# Altium schematic symbol library LATTICEPLDS_Library.SchLib: 291 symbols (part 31 of 32)
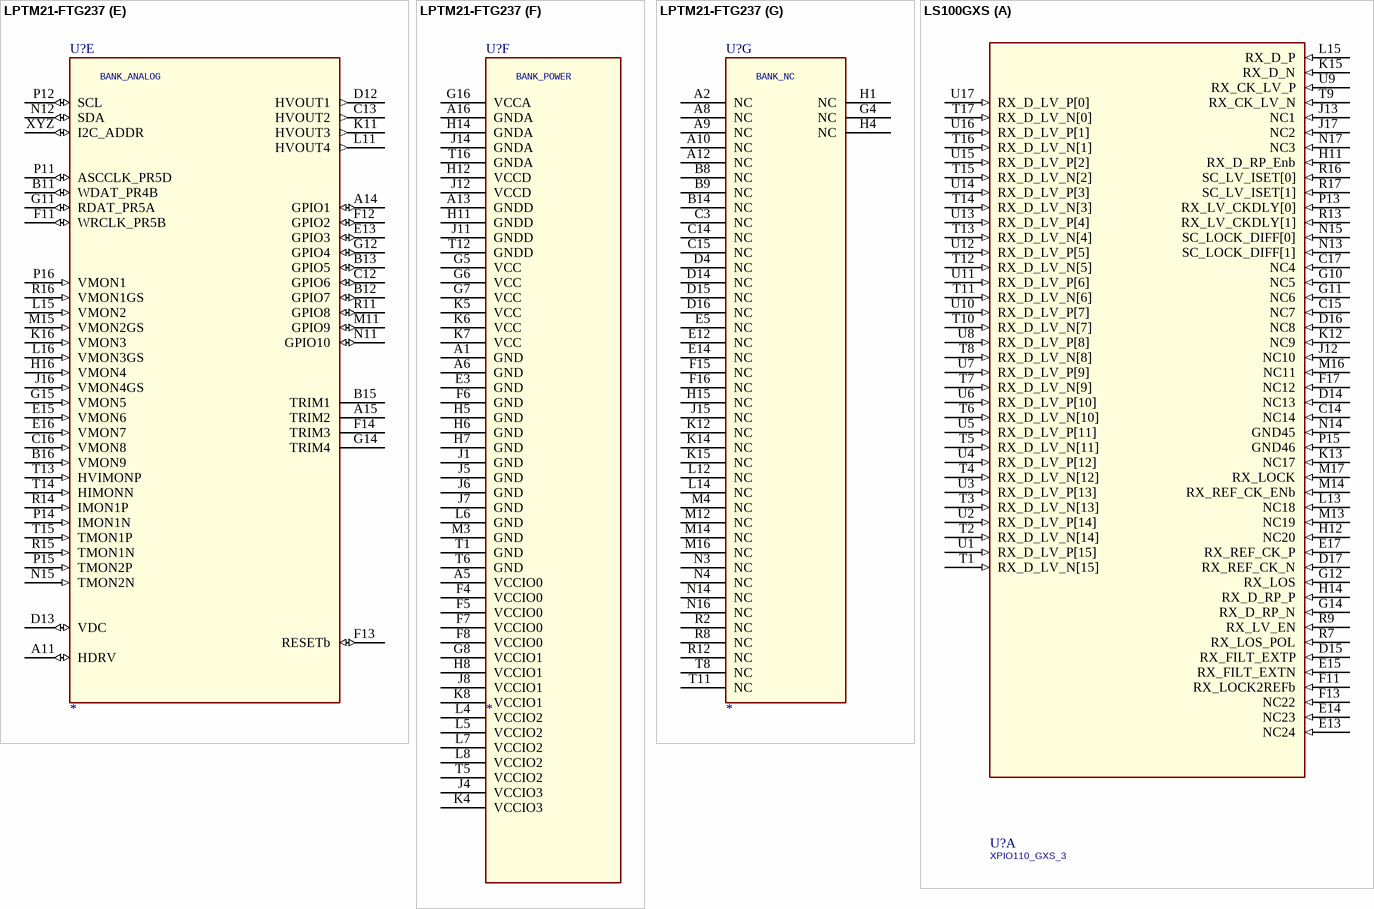
[diagram p333: symbols LPTM21-FTG237 to LS100GXS]

## LPTM21-FTG237
designator U?
part A pins: D1 PL2C || L_GPLLT_IN (io), D2 PL2B || L_GPLLC_FB (io), E1 PL2D || L_GPLLC_IN (io), E2 PL2A || L_GPLLT_FB (io), F1 PL3C (io), F2 PL3A || PCLKT3_2 (io), F3 PL3B || PCLKC3_2 (io), G1 PL3D (io), G2 PL4A (io), G3 PL4B (io), H2 PL4D (io), H3 PL4C (io), J2 PL5A || PCLKT3_1 (io), J3 PL5B || PCLKC3_1 (io), K1 PL8C (io), K2 PL8B (io), K3 PL8A (io), L1 PL8D (io), L2 PL9B || PCLKC3_0 (io), L3 PL9A || PCLKT3_0 (io), M1 PL10A (io), M2 PL10D (io), N1 PL10B (io), N2 PL10C (io)
part B pins: M5 PB4D (io), M6 PB9D (io), M7 PB15D (io), M8 PB20B (io), N5 PB9C (io), N6 PB11A || PCLKT2_1 (io), N7 PB15C (io), N8 PB20A (io), P1 PB4B (io), P2 PB4C || CSSPIN/MD4/TDO8 (io), P3 PB6A (io), P4 PB9A || PCLKT2_0 (io), P5 PB11D (io), P6 PB11B || PCLKC2_1 (io), P7 PB18C (io), P8 PB18D (io), R1 PB4A (io), R3 PB6C || MCLK/CCLK (io), R4 PB9B || PCLKC2_0 (io), R5 PB15A (io), R6 PB15B (io), R7 PB18B (io), R9 PB20D || SI/SIPI/IO0/MD0/TDOR (io), T2 PB6B (io), T3 PB6D || SO/SPISO/IO1/MD1/TDIL (io), T4 PB11C (io), T7 PB18A (io), T9 PB20C || SN/MDS/SCA (io)
part C pins: B10 PR5C (io), C10 PR2B (io), C11 PR2C (io), D8 PT17A (io), D10 PR2A (io), D11 PR2D (io), E8 PT17B (io), E9 PR3B (io), E10 PR3A (io), F10 PR4B (io), L10 PR9A (io), M9 PR9C (io), M10 PR9D (io), N9 PR8D (io), N10 PR10A (io), P9 PR10C (io), P10 PR10B (io), R10 PR10D (io), T10 PR9B (io)
part D pins: A3 PT10D || TDI/MD7 (io), A4 PT12A || PCLKT0_1 (io), A7 PT16A (io), B1 PT9A (io), B2 PT9D (io), B3 PT10C || TDO (io), B4 PT11D || TMS (io), B5 PT15A (io), B6 PT15B (io), B7 PT16B (io), C1 PT9B (io), C2 PT9C (io), C4 PT11C || TCK (io), C5 PT12B || PCLKC0_1 (io), C6 PT12D || SDA/PCLKC (io), C7 PT16C (io), C8 PT16D (io), C9 PT17C || INITN (io), D3 PT10A (io), D5 PT11A (io), D6 PT12C || SCL/PCLKT (io), D7 PT15C || JTAGENb (io), D9 PT17D || DONE (io), E4 PT10B (io), E6 PT11B (io), E7 PT15D || PROGRAMN (io)
part E pins: A11 HDRV (io), A14 GPIO1 (io), A15 TRIM2, B11 WDAT_PR4B (io), B12 GPIO7 (io), B13 GPIO5 (io), B15 TRIM1, B16 VMON9 (in), C12 GPIO6 (io), C13 HVOUT2 (out), C16 VMON8 (in), D12 HVOUT1 (out), D13 VDC (io), E13 GPIO3 (io), E15 VMON6 (in), E16 VMON7 (in), F11 WRCLK_PR5B (io), F12 GPIO2 (io), F13 RESETb (io), F14 TRIM3, G11 RDAT_PR5A (io), G12 GPIO4 (io), G14 TRIM4, G15 VMON5 (in), H16 VMON4 (in), J16 VMON4GS (in), K11 HVOUT3 (out), K16 VMON3 (in), L11 HVOUT4 (out), L15 VMON2 (in), L16 VMON3GS (in), M11 GPIO9 (io), M15 VMON2GS (in), N11 GPIO10 (io), N12 SDA (io), N15 TMON2N (in), P11 ASCCLK_PR5D (io), P12 SCL (io), P14 IMON1N (in), P15 TMON2P (in), P16 VMON1 (in), R11 GPIO8 (io), R14 IMON1P (in), R15 TMON1N (in), R16 VMON1GS (in), T13 HVIMONP (in), T14 HIMONN (in), T15 TMON1P (in), XYZ I2C_ADDR (io)
part F pins: A1 GND (power), A5 VCCIO0 (power), A6 GND (power), A13 GNDD (power), A16 GNDA (power), E3 GND (power), F4 VCCIO0 (power), F5 VCCIO0 (power), F6 GND (power), F7 VCCIO0 (power), F8 VCCIO0 (power), G5 VCC (power), G6 VCC (power), G7 VCC (power), G8 VCCIO1 (power), G16 VCCA (power), H5 GND (power), H6 GND (power), H7 GND (power), H8 VCCIO1 (power), H11 GNDD (power), H12 VCCD (power), H14 GNDA (power), J1 GND (power), J4 VCCIO3 (power), J5 GND (power), J6 GND (power), J7 GND (power), J8 VCCIO1 (power), J11 GNDD (power), J12 VCCD (power), J14 GNDA (power), K4 VCCIO3 (power), K5 VCC (power), K6 VCC (power), K7 VCC (power), K8 VCCIO1 (power), L4 VCCIO2 (power), L5 VCCIO2 (power), L6 GND (power), L7 VCCIO2 (power), L8 VCCIO2 (power), M3 GND (power), T1 GND (power), T5 VCCIO2 (power), T6 GND (power), T12 GNDD (power), T16 GNDA (power)
part G pins: A2 NC (power), A8 NC (power), A9 NC (power), A10 NC (power), A12 NC (power), B8 NC (power), B9 NC (power), B14 NC (power), C3 NC (power), C14 NC (power), C15 NC (power), D4 NC (power), D14 NC (power), D15 NC (power), D16 NC (power), E5 NC (power), E12 NC (power), E14 NC (power), F15 NC (power), F16 NC (power), G4 NC (power), H1 NC (power), H4 NC (power), H15 NC (power), J15 NC (power), K12 NC (power), K14 NC (power), K15 NC (power), L12 NC (power), L14 NC (power), M4 NC (power), M12 NC (power), M14 NC (power), M16 NC (power), N3 NC (power), N4 NC (power), N14 NC (power), N16 NC (power), R2 NC (power), R8 NC (power), R12 NC (power), T8 NC (power), T11 NC (power)
part A text: BANK_TOP; PRI Function || SEC Function(s)
part B text: BANK_BOTTOM; PRI Function || SEC Function(s)
part C text: BANK_LEFT; PRI Function || SEC Function(s)
part D text: BANK_RIGHT; PRI Function || SEC Function(s)
part E text: BANK_ANALOG
part F text: BANK_POWER
part G text: BANK_NC

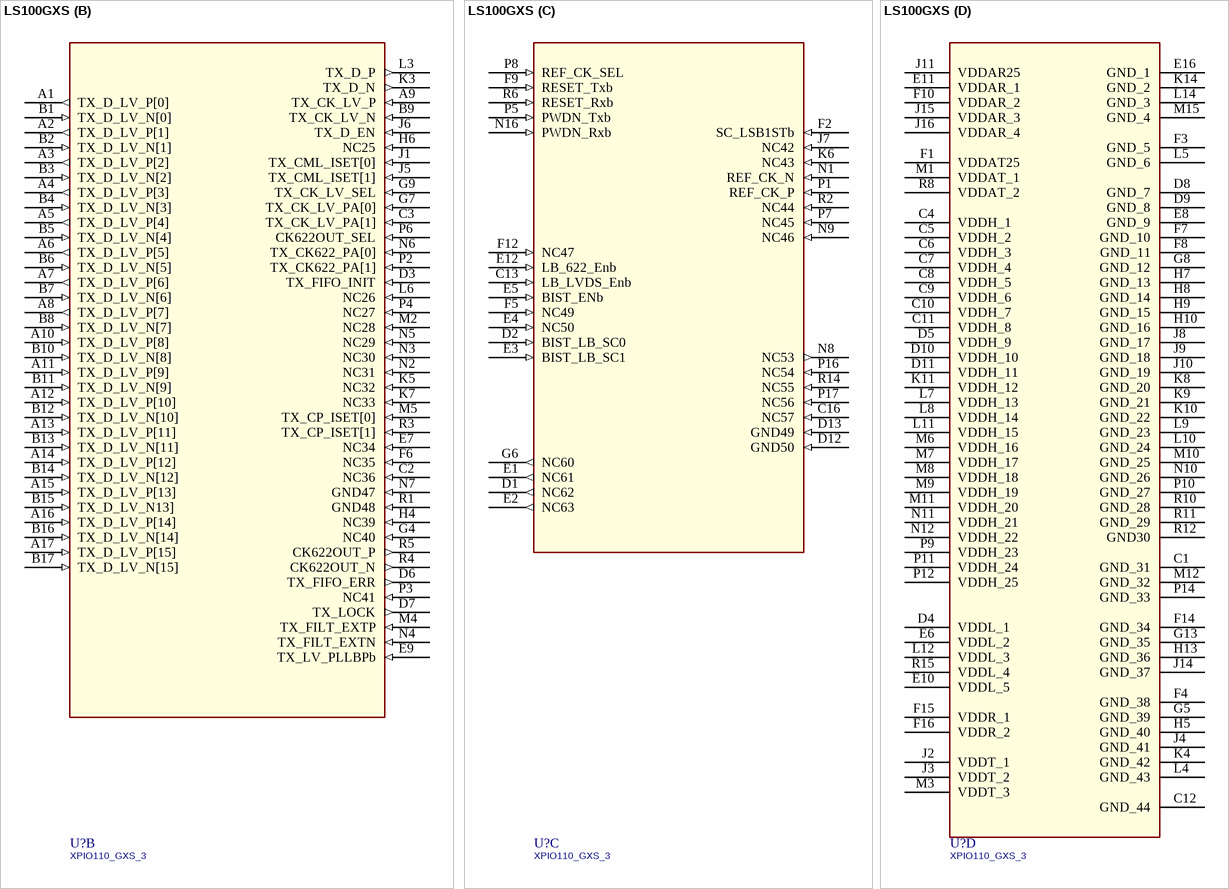
[diagram p285: symbol LS100GXS]

## LS100GXS
designator U?, comment XPIO110_GXS_3
part A pins: C14 NC14 (in), C15 NC7 (in), C17 NC4 (in), D14 NC13 (in), D15 RX_FILT_EXTP (in), D16 NC8 (in), D17 RX_REF_CK_N (in), E13 NC24 (in), E14 NC23 (in), E15 RX_FILT_EXTN (in), E17 RX_REF_CK_P (in), F11 RX_LOCK2REFb (in), F13 NC22 (in), F17 NC12 (in), G10 NC5 (in), G11 NC6 (in), G12 RX_LOS (in), G14 RX_D_RP_N (in), H11 RX_D_RP_Enb (in), H12 NC20 (in), H14 RX_D_RP_P (in), J12 NC10 (in), J13 NC1 (in), J17 NC2 (in), K12 NC9 (in), K13 NC17 (in), K15 RX_D_N (in), L13 NC18 (in), L15 RX_D_P (in), M13 NC19 (in), M14 RX_REF_CK_ENb (in), M16 NC11 (in), M17 RX_LOCK (in), N13 SC_LOCK_DIFF[1] (in), N14 GND45 (in), N15 SC_LOCK_DIFF[0] (in), N17 NC3 (in), P13 RX_LV_CKDLY[0] (in), P15 GND46 (in), R7 RX_LOS_POL (in), R9 RX_LV_EN (in), R13 RX_LV_CKDLY[1] (in), R16 SC_LV_ISET[0] (in), R17 SC_LV_ISET[1] (in), T1 RX_D_LV_N[15] (in), T2 RX_D_LV_N[14] (in), T3 RX_D_LV_N[13] (in), T4 RX_D_LV_N[12] (in), T5 RX_D_LV_N[11] (in), T6 RX_D_LV_N[10] (in), T7 RX_D_LV_N[9] (in), T8 RX_D_LV_N[8] (in), T9 RX_CK_LV_N (in), T10 RX_D_LV_N[7] (in), T11 RX_D_LV_N[6] (in), T12 RX_D_LV_N[5] (in), T13 RX_D_LV_N[4] (in), T14 RX_D_LV_N[3] (in), T15 RX_D_LV_N[2] (in), T16 RX_D_LV_N[1] (in), T17 RX_D_LV_N[0] (in), U1 RX_D_LV_P[15] (in), U2 RX_D_LV_P[14] (in), U3 RX_D_LV_P[13] (in), U4 RX_D_LV_P[12] (in), U5 RX_D_LV_P[11] (in), U6 RX_D_LV_P[10] (in), U7 RX_D_LV_P[9] (in), U8 RX_D_LV_P[8] (in), U9 RX_CK_LV_P (in), U10 RX_D_LV_P[7] (in), U11 RX_D_LV_P[6] (in), U12 RX_D_LV_P[5] (in), U13 RX_D_LV_P[4] (in), U14 RX_D_LV_P[3] (in), U15 RX_D_LV_P[2] (in), U16 RX_D_LV_P[1] (in), U17 RX_D_LV_P[0] (in)
part B pins: A1 TX_D_LV_P[0] (out), A2 TX_D_LV_P[1] (out), A3 TX_D_LV_P[2] (out), A4 TX_D_LV_P[3] (out), A5 TX_D_LV_P[4] (out), A6 TX_D_LV_P[5] (out), A7 TX_D_LV_P[6] (out), A8 TX_D_LV_P[7] (out), A9 TX_CK_LV_P (in), A10 TX_D_LV_P[8] (in), A11 TX_D_LV_P[9] (in), A12 TX_D_LV_P[10] (in), A13 TX_D_LV_P[11] (in), A14 TX_D_LV_P[12] (in), A15 TX_D_LV_P[13] (in), A16 TX_D_LV_P[14] (in), A17 TX_D_LV_P[15] (in), B1 TX_D_LV_N[0] (in), B2 TX_D_LV_N[1] (in), B3 TX_D_LV_N[2] (in), B4 TX_D_LV_N[3] (in), B5 TX_D_LV_N[4] (in), B6 TX_D_LV_N[5] (in), B7 TX_D_LV_N[6] (in), B8 TX_D_LV_N[7] (in), B9 TX_CK_LV_N (in), B10 TX_D_LV_N[8] (in), B11 TX_D_LV_N[9] (in), B12 TX_D_LV_N[10] (in), B13 TX_D_LV_N[11] (in), B14 TX_D_LV_N[12] (in), B15 TX_D_LV_N13] (in), B16 TX_D_LV_N[14] (in), B17 TX_D_LV_N[15] (in), C2 NC36 (in), C3 TX_CK_LV_PA[1] (in), D3 TX_FIFO_INIT (in), D6 TX_FIFO_ERR (out), D7 TX_LOCK (out), E7 NC34 (in), E9 TX_LV_PLLBPb (in), F6 NC35 (in), G4 NC40 (in), G7 TX_CK_LV_PA[0] (in), G9 TX_CK_LV_SEL (in), H4 NC39 (in), H6 NC25 (in), J1 TX_CML_ISET[0] (in), J5 TX_CML_ISET[1] (in), J6 TX_D_EN (in), K3 TX_D_N (out), K5 NC32 (in), K7 NC33 (in), L3 TX_D_P (out), L6 NC26 (in), M2 NC28 (in), M4 TX_FILT_EXTP (in), M5 TX_CP_ISET[0] (in), N2 NC31 (in), N3 NC30 (in), N4 TX_FILT_EXTN (in), N5 NC29 (in), N6 TX_CK622_PA[0] (in), N7 GND47 (in), P2 TX_CK622_PA[1] (in), P3 NC41 (in), P4 NC27 (in), P6 CK622OUT_SEL (in), R1 GND48 (in), R3 TX_CP_ISET[1] (in), R4 CK622OUT_N (out), R5 CK622OUT_P (out)
part C pins: C13 LB_LVDS_Enb (in), C16 NC57 (in), D1 NC62 (out), D2 BIST_LB_SC0 (in), D12 GND50 (in), D13 GND49 (in), E1 NC61 (out), E2 NC63 (out), E3 BIST_LB_SC1 (in), E4 NC50 (in), E5 BIST_ENb (in), E12 LB_622_Enb (in), F2 SC_LSB1STb (in), F5 NC49 (in), F9 RESET_Txb (in), F12 NC47 (in), G6 NC60 (out), J7 NC42 (in), K6 NC43 (in), N1 REF_CK_N (in), N8 NC53 (out), N9 NC46 (in), N16 PWDN_Rxb (in), P1 REF_CK_P (in), P5 PWDN_Txb (in), P7 NC45 (in), P8 REF_CK_SEL (in), P16 NC54 (in), P17 NC56 (in), R2 NC44 (in), R6 RESET_Rxb (in), R14 NC55 (in)
part D pins: C1 GND_31 (power), C4 VDDH_1 (power), C5 VDDH_2 (power), C6 VDDH_3 (power), C7 VDDH_4 (power), C8 VDDH_5 (power), C9 VDDH_6 (power), C10 VDDH_7 (power), C11 VDDH_8 (power), C12 GND_44 (power), D4 VDDL_1 (power), D5 VDDH_9 (power), D8 GND_7 (power), D9 GND_8 (power), D10 VDDH_10 (power), D11 VDDH_11 (power), E6 VDDL_2 (power), E8 GND_9 (power), E10 VDDL_5 (power), E11 VDDAR_1 (power), E16 GND_1 (power), F1 VDDAT25 (power), F3 GND_5 (power), F4 GND_38 (power), F7 GND_10 (power), F8 GND_11 (power), F10 VDDAR_2 (power), F14 GND_34 (power), F15 VDDR_1 (power), F16 VDDR_2 (power), G5 GND_39 (power), G8 GND_12 (power), G13 GND_35 (power), H5 GND_40 (power), H7 GND_13 (power), H8 GND_14 (power), H9 GND_15 (power), H10 GND_16 (power), H13 GND_36 (power), J2 VDDT_1 (power), J3 VDDT_2 (power), J4 GND_41 (power), J8 GND_17 (power), J9 GND_18 (power), J10 GND_19 (power), J11 VDDAR25 (power), J14 GND_37 (power), J15 VDDAR_3 (power), J16 VDDAR_4 (power), K4 GND_42 (power), K8 GND_20 (power), K9 GND_21 (power), K10 GND_22 (power), K11 VDDH_12 (power), K14 GND_2 (power), L4 GND_43 (power), L5 GND_6 (power), L7 VDDH_13 (power), L8 VDDH_14 (power), L9 GND_23 (power), L10 GND_24 (power), L11 VDDH_15 (power), L12 VDDL_3 (power), L14 GND_3 (power), M1 VDDAT_1 (power), M3 VDDT_3 (power), M6 VDDH_16 (power), M7 VDDH_17 (power), M8 VDDH_18 (power), M9 VDDH_19 (power), M10 GND_25 (power), M11 VDDH_20 (power), M12 GND_32 (power), M15 GND_4 (power), N10 GND_26 (power), N11 VDDH_21 (power), N12 VDDH_22 (power), P9 VDDH_23 (power), P10 GND_27 (power), P11 VDDH_24 (power), P12 VDDH_25 (power), P14 GND_33 (power), R8 VDDAT_2 (power), R10 GND_28 (power), R11 GND_29 (power), R12 GND30 (power), R15 VDDL_4 (power)

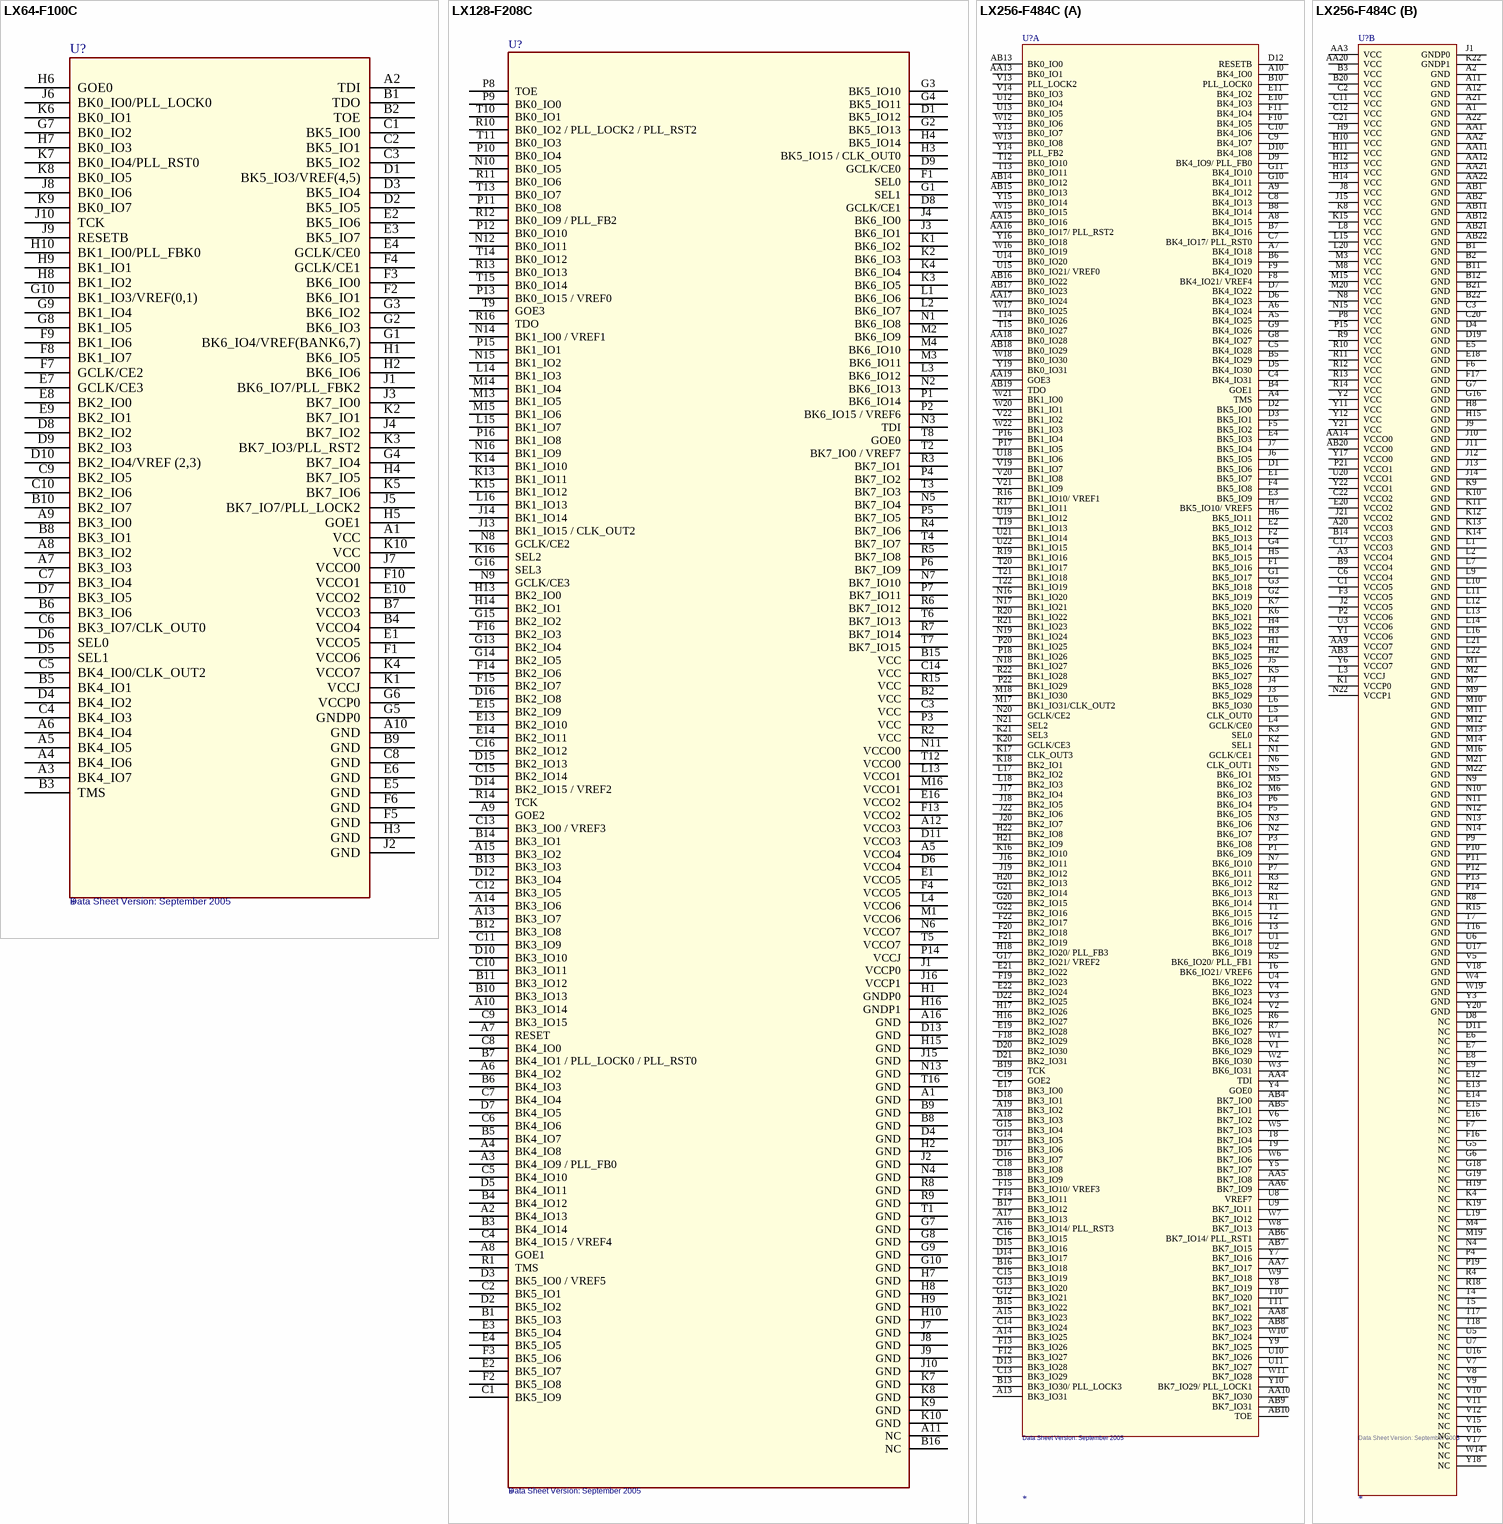
[diagram p286: symbols LX64-F100C to LX256-F484C]

## LX64-F100C
designator U?  Data Sheet Version: September 2005
pins: A1 VCC (power), A2 TDI, A3 BK4_IO7, A4 BK4_IO6, A5 BK4_IO5, A6 BK4_IO4, A7 BK3_IO3, A8 BK3_IO2, A9 BK3_IO0, A10 GND (power), B1 TDO, B2 TOE, B3 TMS, B4 VCCO4 (power), B5 BK4_IO1, B6 BK3_IO6, B7 VCCO3 (power), B8 BK3_IO1, B9 GND (power), B10 BK2_IO7, C1 BK5_IO0, C2 BK5_IO1, C3 BK5_IO2, C4 BK4_IO3, C5 BK4_IO0/CLK_OUT2, C6 BK3_IO7/CLK_OUT0, C7 BK3_IO4, C8 GND (power), C9 BK2_IO5, C10 BK2_IO6, D1 BK5_IO3/VREF(4,5), D2 BK5_IO5, D3 BK5_IO4, D4 BK4_IO2, D5 SEL1, D6 SEL0, D7 BK3_IO5, D8 BK2_IO2, D9 BK2_IO3, D10 BK2_IO4/VREF (2,3), E1 VCCO5 (power), E2 BK5_IO6, E3 BK5_IO7, E4 GCLK/CE0, E5 GND (power), E6 GND (power), E7 GCLK/CE3, E8 BK2_IO0, E9 BK2_IO1, E10 VCCO2 (power), F1 VCCO6 (power), F2 BK6_IO1, F3 BK6_IO0, F4 GCLK/CE1, F5 GND (power), F6 GND (power), F7 GCLK/CE2, F8 BK1_IO7, F9 BK1_IO6, F10 VCCO1 (power), G1 BK6_IO4/VREF(BANK6,7), G2 BK6_IO3, G3 BK6_IO2, G4 BK7_IO4, G5 GNDP0 (power), G6 VCCP0 (power), G7 BK0_IO2, G8 BK1_IO5, G9 BK1_IO4, G10 BK1_IO3/VREF(0,1), H1 BK6_IO5, H2 BK6_IO6, H3 GND (power), H4 BK7_IO5, H5 GOE1, H6 GOE0, H7 BK0_IO3, H8 BK1_IO2, H9 BK1_IO1, H10 BK1_IO0/PLL_FBK0, J1 BK6_IO7/PLL_FBK2, J2 GND (power), J3 BK7_IO0, J4 BK7_IO2, J5 BK7_IO7/PLL_LOCK2, J6 BK0_IO0/PLL_LOCK0, J7 VCCO0 (power), J8 BK0_IO6, J9 RESETB, J10 TCK, K1 VCCJ (power), K2 BK7_IO1, K3 BK7_IO3/PLL_RST2, K4 VCCO7 (power), K5 BK7_IO6, K6 BK0_IO1, K7 BK0_IO4/PLL_RST0, K8 BK0_IO5, K9 BK0_IO7, K10 VCC (power)

## LX128-F208C
designator U?  Data Sheet Version: September 2005
pins: A1 GND (power), A2 BK4_IO13, A3 BK4_IO9 / PLL_FB0, A4 BK4_IO8, A5 VCCO4 (power), A6 BK4_IO2, A7 RESET, A8 GOE1, A9 GOE2, A10 BK3_IO14, A11 NC, A12 VCCO3 (power), A13 BK3_IO7, A14 BK3_IO6, A15 BK3_IO2, A16 GND (power), B1 BK5_IO3, B2 VCC (power), B3 BK4_IO14, B4 BK4_IO12, B5 BK4_IO7, B6 BK4_IO3, B7 BK4_IO1 / PLL_LOCK0 / PLL_RST0, B8 GND (power), B9 GND (power), B10 BK3_IO13, B11 BK3_IO12, B12 BK3_IO8, B13 BK3_IO3, B14 BK3_IO1, B15 VCC (power), B16 NC, C1 BK5_IO9, C2 BK5_IO1, C3 VCC (power), C4 BK4_IO15 / VREF4, C5 BK4_IO10, C6 BK4_IO6, C7 BK4_IO4, C8 BK4_IO0, C9 BK3_IO15, C10 BK3_IO11, C11 BK3_IO9, C12 BK3_IO5, C13 BK3_IO0 / VREF3, C14 VCC (power), C15 BK2_IO14, C16 BK2_IO12, D1 BK5_IO12, D2 BK5_IO2, D3 BK5_IO0 / VREF5, D4 GND (power), D5 BK4_IO11, D6 VCCO4 (power), D7 BK4_IO5, D8 GCLK/CE1, D9 GCLK/CE0, D10 BK3_IO10, D11 VCCO3 (power), D12 BK3_IO4, D13 GND (power), D14 BK2_IO15 / VREF2, D15 BK2_IO13, D16 BK2_IO8, E1 VCCO5 (power), E2 BK5_IO7, E3 BK5_IO4, E4 BK5_IO5, E13 BK2_IO10, E14 BK2_IO11, E15 BK2_IO9, E16 VCCO2 (power), F1 SEL0, F2 BK5_IO8, F3 BK5_IO6, F4 VCCO5 (power), F13 VCCO2 (power), F14 BK2_IO6, F15 BK2_IO7, F16 BK2_IO3, G1 SEL1, G2 BK5_IO13, G3 BK5_IO10, G4 BK5_IO11, G7 GND (power), G8 GND (power), G9 GND (power), G10 GND (power), G13 BK2_IO4, G14 BK2_IO5, G15 BK2_IO2, G16 SEL3, H1 GNDP0 (power), H2 GND (power), H3 BK5_IO15 / CLK_OUT0, H4 BK5_IO14, H7 GND (power), H8 GND (power), H9 GND (power), H10 GND (power), H13 BK2_IO0, H14 BK2_IO1, H15 GND (power), H16 GNDP1 (power), J1 VCCP0 (power), J2 GND (power), J3 BK6_IO1, J4 BK6_IO0, J7 GND (power), J8 GND (power), J9 GND (power), J10 GND (power), J13 BK1_IO15 / CLK_OUT2, J14 BK1_IO14, J15 GND (power), J16 VCCP1 (power), K1 BK6_IO2, K2 BK6_IO3, K3 BK6_IO5, K4 BK6_IO4, K7 GND (power), K8 GND (power), K9 GND (power), K10 GND (power), K13 BK1_IO11, K14 BK1_IO10, K15 BK1_IO12, K16 SEL2, L1 BK6_IO6, L2 BK6_IO7, L3 BK6_IO12, L4 VCCO6 (power), L13 VCCO1 (power), L14 BK1_IO3, L15 BK1_IO7, L16 BK1_IO13, M1 VCCO6 (power), M2 BK6_IO9, M3 BK6_IO11, M4 BK6_IO10, M13 BK1_IO5, M14 BK1_IO4, M15 BK1_IO6, M16 VCCO1 (power), N1 BK6_IO8, N2 BK6_IO13, N3 TDI, N4 GND (power), N5 BK7_IO4, N6 VCCO7 (power), N7 BK7_IO10, N8 GCLK/CE2, N9 GCLK/CE3, N10 BK0_IO5, N11 VCCO0 (power), N12 BK0_IO11, N13 GND (power), N14 BK1_IO0 / VREF1, N15 BK1_IO2, N16 BK1_IO9, P1 BK6_IO14, P2 BK6_IO15 / VREF6, P3 VCC (power), P4 BK7_IO2, P5 BK7_IO5, P6 BK7_IO9, P7 BK7_IO11, P8 TOE, P9 BK0_IO0, P10 BK0_IO4, P11 BK0_IO8, P12 BK0_IO10, P13 BK0_IO15 / VREF0, P14 VCCJ (power), P15 BK1_IO1, P16 BK1_IO8, R1 TMS, R2 VCC (power), R3 BK7_IO1, R4 BK7_IO6, R5 BK7_IO8, R6 BK7_IO12, R7 BK7_IO14, R8 GND (power), R9 GND (power), R10 BK0_IO2 / PLL_LOCK2 / PLL_RST2, R11 BK0_IO6, R12 BK0_IO9 / PLL_FB2, R13 BK0_IO13, R14 TCK, R15 VCC (power), R16 TDO, T1 GND (power), T2 BK7_IO0 / VREF7, T3 BK7_IO3, T4 BK7_IO7, T5 VCCO7 (power), T6 BK7_IO13, T7 BK7_IO15, T8 GOE0, T9 GOE3, T10 BK0_IO1, T11 BK0_IO3, T12 VCCO0 (power), T13 BK0_IO7, T14 BK0_IO12, T15 BK0_IO14, T16 GND (power)

## LX256-F484C
designator U?  Data Sheet Version: September 2005
SPLIT_INST: TRUE; SWAP_INFO: (S1+S2)
part A pins: A4 TMS, A5 BK4_IO25, A6 BK4_IO24, A7 BK4_IO18, A8 BK4_IO15, A9 BK4_IO12, A10 BK4_IO0, A13 BK3_IO31, A14 BK3_IO25, A15 BK3_IO23, A16 BK3_IO14/ PLL_RST3, A17 BK3_IO13, A18 BK3_IO3, A19 BK3_IO2, AA4 TDI, AA5 BK7_IO8, AA6 BK7_IO9, AA7 BK7_IO17, AA8 BK7_IO22, AA10 BK7_IO30, AA13 BK0_IO1, AA15 BK0_IO16, AA16 BK0_IO17/ PLL_RST2, AA17 BK0_IO24, AA18 BK0_IO28, AA19 GOE3, AB4 BK7_IO0, AB5 BK7_IO1, AB6 BK7_IO14/ PLL_RST1, AB7 BK7_IO15, AB8 BK7_IO23, AB9 BK7_IO31, AB10 TOE, AB13 BK0_IO0, AB14 BK0_IO12, AB15 BK0_IO13, AB16 BK0_IO22, AB17 BK0_IO23, AB18 BK0_IO29, AB19 TDO, B4 GOE1, B5 BK4_IO29, B6 BK4_IO19, B7 BK4_IO16, B8 BK4_IO14, B10 PLL_LOCK0, B13 BK3_IO30/ PLL_LOCK3, B15 BK3_IO22, B16 BK3_IO18, B17 BK3_IO12, B18 BK3_IO9, B19 TCK, C4 BK4_IO31, C5 BK4_IO28, C7 BK4_IO17/ PLL_RST0, C8 BK4_IO13, C9 BK4_IO7, C10 BK4_IO6, C13 BK3_IO29, C14 BK3_IO24, C15 BK3_IO19, C16 BK3_IO15, C18 BK3_IO8, C19 GOE2, D1 BK5_IO6, D2 BK5_IO0, D3 BK5_IO1, D5 BK4_IO30, D6 BK4_IO23, D7 BK4_IO22, D9 BK4_IO9/ PLL_FB0, D10 BK4_IO8, D12 RESETB, D13 BK3_IO28, D14 BK3_IO17, D15 BK3_IO16, D16 BK3_IO7, D17 BK3_IO6, D18 BK3_IO1, D20 BK2_IO30, D21 BK2_IO31, D22 BK2_IO25, E1 BK5_IO7, E2 BK5_IO12, E3 BK5_IO9, E4 BK5_IO3, E10 BK4_IO3, E11 BK4_IO2, E17 BK3_IO0, E19 BK2_IO28, E21 BK2_IO22, E22 BK2_IO24, F1 BK5_IO16, F2 BK5_IO13, F4 BK5_IO8, F5 BK5_IO2, F8 BK4_IO21/ VREF4, F9 BK4_IO20, F10 BK4_IO5, F11 BK4_IO4, F12 BK3_IO27, F13 BK3_IO26, F14 BK3_IO11, F15 BK3_IO10/ VREF3, F18 BK2_IO29, F19 BK2_IO23, F20 BK2_IO18, F21 BK2_IO19, F22 BK2_IO17, G1 BK5_IO17, G2 BK5_IO19, G3 BK5_IO18, G4 BK5_IO14, G8 BK4_IO27, G9 BK4_IO26, G10 BK4_IO11, G11 BK4_IO10, G12 BK3_IO21, G13 BK3_IO20, G14 BK3_IO5, G15 BK3_IO4, G17 BK2_IO21/ VREF2, G20 BK2_IO15, G21 BK2_IO14, G22 BK2_IO16, H1 BK5_IO24, H2 BK5_IO25, H3 BK5_IO23, H4 BK5_IO22, H5 BK5_IO15, H6 BK5_IO11, H7 BK5_IO10/ VREF5, H16 BK2_IO27, H17 BK2_IO26, H18 BK2_IO20/ PLL_FB3, H20 BK2_IO13, H21 BK2_IO9, H22 BK2_IO8, J3 BK5_IO29, J4 BK5_IO28, J5 BK5_IO26, J6 BK5_IO5, J7 BK5_IO4, J16 BK2_IO11, J17 BK2_IO4, J18 BK2_IO5, J19 BK2_IO12, J20 BK2_IO7, J22 BK2_IO6, K2 SEL1, K3 SEL0, K5 BK5_IO27, K6 BK5_IO21, K7 BK5_IO20, K16 BK2_IO10, K17 CLK_OUT3, K18 BK2_IO1, K20 GCLK/CE3, K21 SEL3, L4 GCLK/CE0, L5 CLK_OUT0, L6 BK5_IO30, L17 BK2_IO2, L18 BK2_IO3, M5 BK6_IO2, M6 BK6_IO3, M17 BK1_IO31/CLK_OUT2, M18 BK1_IO30, N1 GCLK/CE1, N2 BK6_IO7, N3 BK6_IO6, N5 BK6_IO1, N6 CLK_OUT1, N7 BK6_IO10, N16 BK1_IO20, N17 BK1_IO21, N18 BK1_IO27, N19 BK1_IO24, N20 GCLK/CE2, N21 SEL2, P1 BK6_IO9, P3 BK6_IO8, P5 BK6_IO5, P6 BK6_IO4, P7 BK6_IO11, P16 BK1_IO4, P17 BK1_IO5, P18 BK1_IO26, P20 BK1_IO25, P22 BK1_IO29, R1 BK6_IO14, R2 BK6_IO13, R3 BK6_IO12, R5 BK6_IO20/ PLL_FB1, R6 BK6_IO26, R7 BK6_IO27, R16 BK1_IO10/ VREF1, R17 BK1_IO11, R19 BK1_IO16, R20 BK1_IO22, R21 BK1_IO23, R22 BK1_IO28, T1 BK6_IO15, T2 BK6_IO16, T3 BK6_IO17, T6 BK6_IO21/ VREF6, T8 BK7_IO4, T9 BK7_IO5, T10 BK7_IO20, T11 BK7_IO21, T12 BK0_IO10, T13 BK0_IO11, T14 BK0_IO26, T15 BK0_IO27, T19 BK1_IO13, T20 BK1_IO17, T21 BK1_IO18, T22 BK1_IO19, U1 BK6_IO18, U2 BK6_IO19, U4 BK6_IO22, U8 VREF7, U9 BK7_IO11, U10 BK7_IO26, U11 BK7_IO27, U12 BK0_IO4, U13 BK0_IO5, U14 BK0_IO20, U15 BK0_IO21/ VREF0, U18 BK1_IO6, U19 BK1_IO12, U21 BK1_IO14, U22 BK1_IO15, V1 BK6_IO29, V2 BK6_IO25, V3 BK6_IO24, V4 BK6_IO23, V6 BK7_IO2, V13 PLL_LOCK2, V14 BK0_IO3, V19 BK1_IO7, V20 BK1_IO8, V21 BK1_IO9, V22 BK1_IO2, W1 BK6_IO28, W2 BK6_IO30, W3 BK6_IO31, W5 BK7_IO3, W6 BK7_IO6, W7 BK7_IO12, W8 BK7_IO13, W9 BK7_IO18, W10 BK7_IO24, W11 BK7_IO28, W12 BK0_IO6, W13 BK0_IO8, W15 BK0_IO15, W16 BK0_IO19, W17 BK0_IO25, W18 BK0_IO30, W20 BK1_IO1, W21 BK1_IO0, W22 BK1_IO3, Y4 GOE0, Y5 BK7_IO7, Y7 BK7_IO16, Y8 BK7_IO19, Y9 BK7_IO25, Y10 BK7_IO29/ PLL_LOCK1, Y13 BK0_IO7, Y14 PLL_FB2, Y15 BK0_IO14, Y16 BK0_IO18, Y19 BK0_IO31
part B pins: A1 GND (power), A2 GND (power), A3 VCCO4 (power), A11 GND (power), A12 GND (power), A20 VCCO3 (power), A21 GND (power), A22 GND (power), AA1 GND (power), AA2 GND (power), AA3 VCC (power), AA9 VCCO7 (power), AA11 GND (power), AA12 GND (power), AA14 VCCO0 (power), AA20 VCC (power), AA21 GND (power), AA22 GND (power), AB1 GND (power), AB2 GND (power), AB3 VCCO7 (power), AB11 GND (power), AB12 GND (power), AB20 VCCO0 (power), AB21 GND (power), AB22 GND (power), B1 GND (power), B2 GND (power), B3 VCC (power), B9 VCCO4 (power), B11 GND (power), B12 GND (power), B14 VCCO3 (power), B20 VCC (power), B21 GND (power), B22 GND (power), C1 VCCO5 (power), C2 VCC (power), C3 GND (power), C6 VCCO4 (power), C11 VCC (power), C12 VCC (power), C17 VCCO3 (power), C20 GND (power), C21 VCC (power), C22 VCCO2 (power), D4 GND (power), D8 NC, D11 NC, D19 GND (power), E5 GND (power), E6 NC, E7 NC, E8 NC, E9 NC, E12 NC, E13 NC, E14 NC, E15 NC, E16 NC, E18 GND (power), E20 VCCO2 (power), F3 VCCO5 (power), F6 GND (power), F7 NC, F16 NC, F17 GND (power), G5 NC, G6 NC, G7 GND (power), G16 GND (power), G18 NC, G19 NC, H8 GND (power), H9 VCC (power), H10 VCC (power), H11 VCC (power), H12 VCC (power), H13 VCC (power), H14 VCC (power), H15 GND (power), H19 NC, J1 GNDP0 (power), J2 VCCO5 (power), J8 VCC (power), J9 GND (power), J10 GND (power), J11 GND (power), J12 GND (power), J13 GND (power), J14 GND (power), J15 VCC (power), J21 VCCO2 (power), K1 VCCP0 (power), K4 NC, K8 VCC (power), K9 GND (power), K10 GND (power), K11 GND (power), K12 GND (power), K13 GND (power), K14 GND (power), K15 VCC (power), K19 NC, K22 GNDP1 (power), L1 GND (power), L2 GND (power), L3 VCCJ (power), L7 GND (power), L8 VCC (power), L9 GND (power), L10 GND (power), L11 GND (power), L12 GND (power), L13 GND (power), L14 GND (power), L15 VCC (power), L16 GND (power), L19 NC, L20 VCC (power), L21 GND (power), L22 GND (power), M1 GND (power), M2 GND (power), M3 VCC (power), M4 NC, M7 GND (power), M8 VCC (power), M9 GND (power), M10 GND (power), M11 GND (power), M12 GND (power), M13 GND (power), M14 GND (power), M15 VCC (power), M16 GND (power), M19 NC, M20 VCC (power), M21 GND (power), M22 GND (power), N4 NC, N8 VCC (power), N9 GND (power), N10 GND (power), N11 GND (power), N12 GND (power), N13 GND (power), N14 GND (power), N15 VCC (power), N22 VCCP1 (power), P2 VCCO6 (power), P4 NC, P8 VCC (power), P9 GND (power), P10 GND (power), P11 GND (power), P12 GND (power), P13 GND (power), P14 GND (power), P15 VCC (power), P19 NC, P21 VCCO1 (power), R4 NC, R8 GND (power), R9 VCC (power), R10 VCC (power), R11 VCC (power), R12 VCC (power), R13 VCC (power), R14 VCC (power), R15 GND (power), R18 NC, T4 NC, T5 NC, T7 GND (power), T16 GND (power), T17 NC, T18 NC, U3 VCCO6 (power), U5 NC, U6 GND (power), U7 NC, U16 NC, U17 GND (power), U20 VCCO1 (power), V5 GND (power), V7 NC, V8 NC, V9 NC, V10 NC, V11 NC, V12 NC, V15 NC, V16 NC, V17 NC, V18 GND (power), W4 GND (power), W14 NC, W19 GND (power), Y1 VCCO6 (power), Y2 VCC (power), Y3 GND (power), Y6 VCCO7 (power), Y11 VCC (power), Y12 VCC (power), Y17 VCCO0 (power), Y18 NC, Y20 GND (power), Y21 VCC (power), Y22 VCCO1 (power)
